# Altium schematic symbol library FPGA_Xilinx_Virtex7.SchLib: 34 symbols (part 7 of 34) (continued)
## XC7VH580T-HCG1155 (continued)
part M pins: AA3 GND (power), AA4 GND (power), AA7 GND (power), AA9 GND (power), AA11 GND (power), AA13 GND (power), AA15 GND (power), AA16 GND (power), AA17 GND (power), AA19 GND (power), AA21 GND (power), AA23 GND (power), AA25 GND (power), AA28 GND (power), AA31 GND (power), AA32 GND (power), AB1 GND (power), AB6 GND (power), AB7 GND (power), AB8 GND (power), AB10 GND (power), AB12 GND (power), AB13 GND (power), AB23 GND (power), AB28 GND (power), AB29 GND (power), AB34 GND (power), AC3 GND (power), AC7 GND (power), AC10 GND (power), AC20 GND (power), AC28 GND (power), AC32 GND (power), AD1 GND (power), AD5 GND (power), AD6 GND (power), AD7 GND (power), AD17 GND (power), AD27 GND (power), AD28 GND (power), AD29 GND (power), AD30 GND (power), AD34 GND (power), AE3 GND (power), AE4 GND (power), AE5 GND (power), AE14 GND (power), AE24 GND (power), AE30 GND (power), AE31 GND (power), AE32 GND (power), AF1 GND (power), AF2 GND (power), AF3 GND (power), AF11 GND (power), AF21 GND (power), AF31 GND (power), AF32 GND (power), AF33 GND (power), AF34 GND (power), AG8 GND (power), AG18 GND (power), AG28 GND (power), AH5 GND (power), AH15 GND (power), AH25 GND (power), AJ2 GND (power), AJ12 GND (power), AJ22 GND (power), AJ32 GND (power), AK9 GND (power), AK19 GND (power), AK29 GND (power), AL6 GND (power), AL16 GND (power), AL26 GND (power), AM3 GND (power), AM13 GND (power), AM23 GND (power), AM33 GND (power), AN10 GND (power), AN20 GND (power), AN30 GND (power), AP7 GND (power), AP17 GND (power), AP27 GND (power), AP34 GND (power), L5 GND (power), L6 GND (power), L13 GND (power), L15 GND (power), L17 GND (power), L19 GND (power), L21 GND (power), L22 GND (power), L26 GND (power), L30 GND (power), L32 GND (power), M1 GND (power), M2 GND (power), M5 GND (power), M6 GND (power), M7 GND (power), M14 GND (power), M16 GND (power), M18 GND (power), M20 GND (power), M22 GND (power), M23 GND (power), M28 GND (power), M29 GND (power), M30 GND (power), M33 GND (power), M34 GND (power), N3 GND (power), N4 GND (power), N7 GND (power), N10 GND (power), N13 GND (power), N15 GND (power), N19 GND (power), N21 GND (power), N28 GND (power), N31 GND (power), N32 GND (power), P1 GND (power), P6 GND (power), P7 GND (power), P16 GND (power), P22 GND (power), P27 GND (power), P28 GND (power), P29 GND (power), P34 GND (power), R3 GND (power), R7 GND (power), R13 GND (power), R17 GND (power), R18 GND (power), R19 GND (power), R21 GND (power), R24 GND (power), R28 GND (power), R32 GND (power), T1 GND (power), T2 GND (power), T5 GND (power), T6 GND (power), T7 GND (power), T8 GND (power), T10 GND (power), T12 GND (power), T14 GND (power), T16 GND (power), T20 GND (power), T22 GND (power), T26 GND (power), T28 GND (power), T29 GND (power), T30 GND (power), T33 GND (power), T34 GND (power), U3 GND (power), U4 GND (power), U7 GND (power), U9 GND (power), U11 GND (power), U13 GND (power), U15 GND (power), U19 GND (power), U21 GND (power), U23 GND (power), U25 GND (power), U28 GND (power), U31 GND (power), U32 GND (power), V1 GND (power), V5 GND (power), V7 GND (power), V10 GND (power), V12 GND (power), V14 GND (power), V16 GND (power), V20 GND (power), V22 GND (power), V24 GND (power), V26 GND (power), V28 GND (power), V30 GND (power), V34 GND (power), W3 GND (power), W7 GND (power), W9 GND (power), W11 GND (power), W13 GND (power), W15 GND (power), W19 GND (power), W21 GND (power), W23 GND (power), W25 GND (power), W28 GND (power), W32 GND (power), Y1 GND (power), Y2 GND (power), Y5 GND (power), Y6 GND (power), Y7 GND (power), Y10 GND (power), Y12 GND (power), Y14 GND (power), Y16 GND (power), Y18 GND (power), Y20 GND (power), Y22 GND (power), Y24 GND (power), Y26 GND (power), Y28 GND (power), Y29 GND (power), Y30 GND (power), Y33 GND (power), Y34 GND (power)

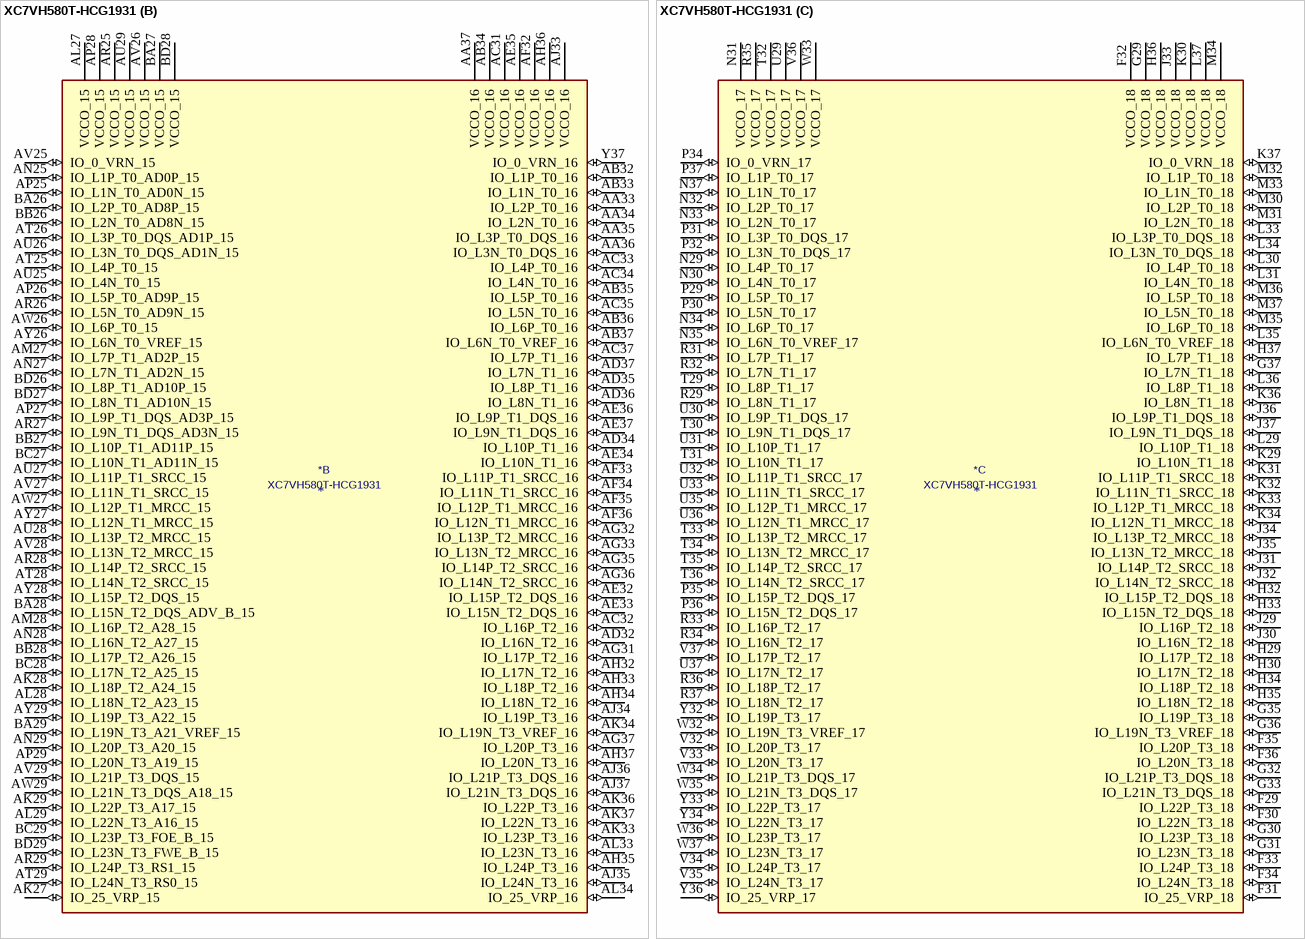
[diagram p37: symbol XC7VH580T-HCG1931]

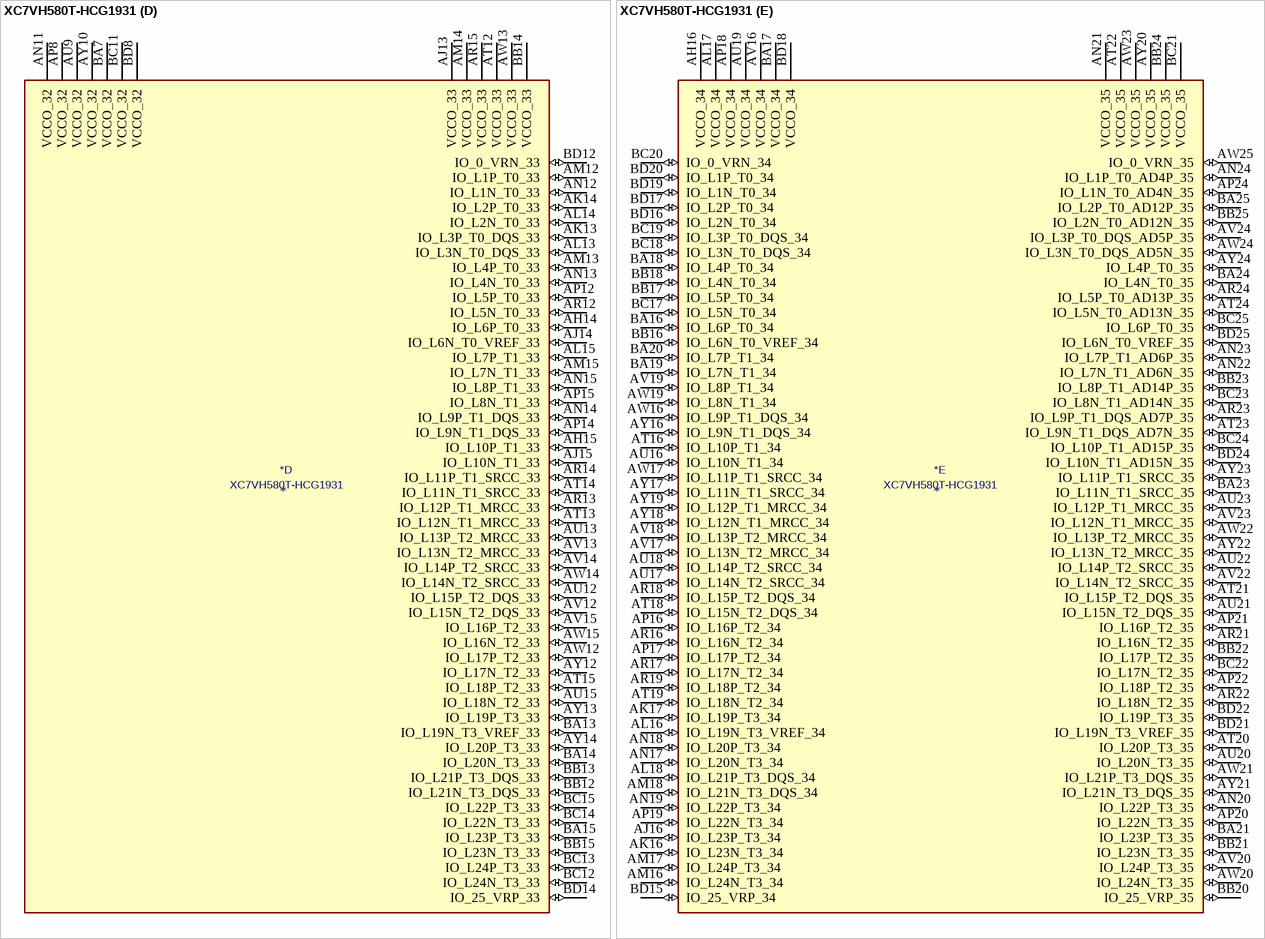
[diagram p38: symbol XC7VH580T-HCG1931]

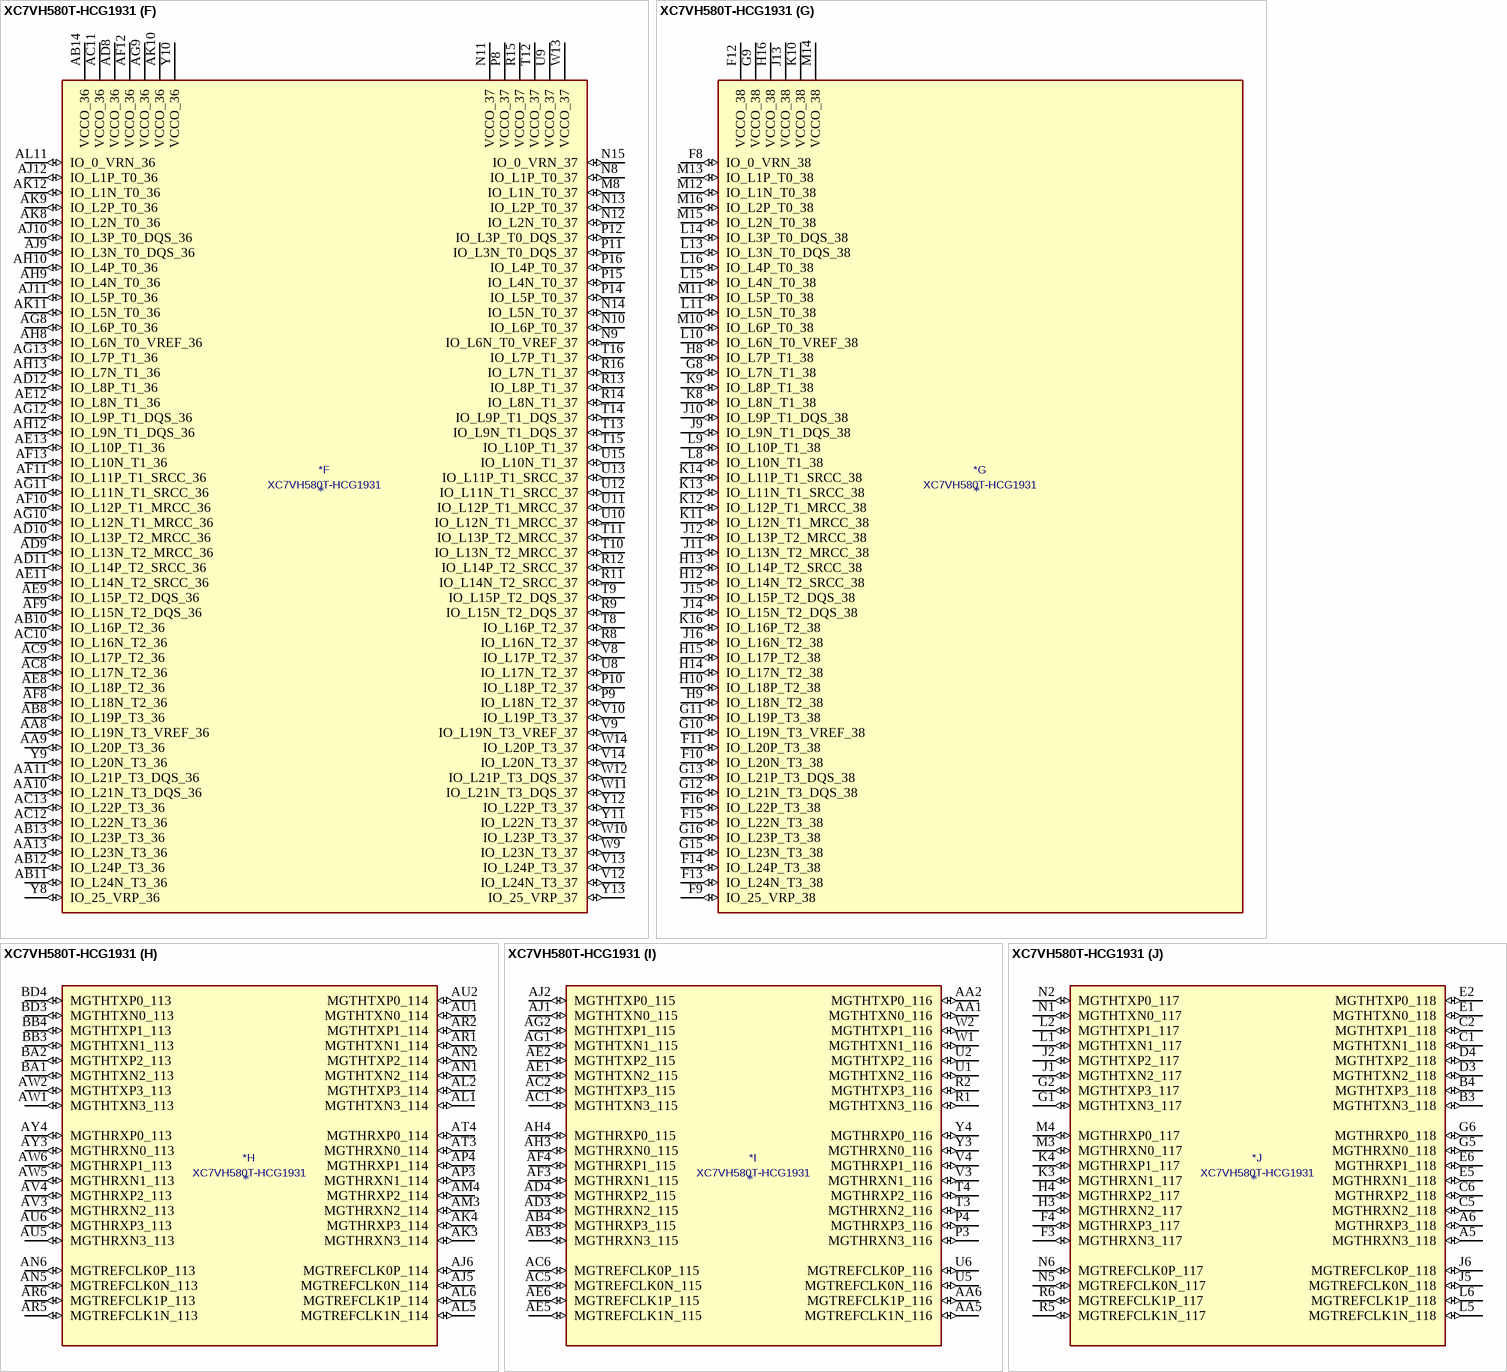
[diagram p39: symbol XC7VH580T-HCG1931]

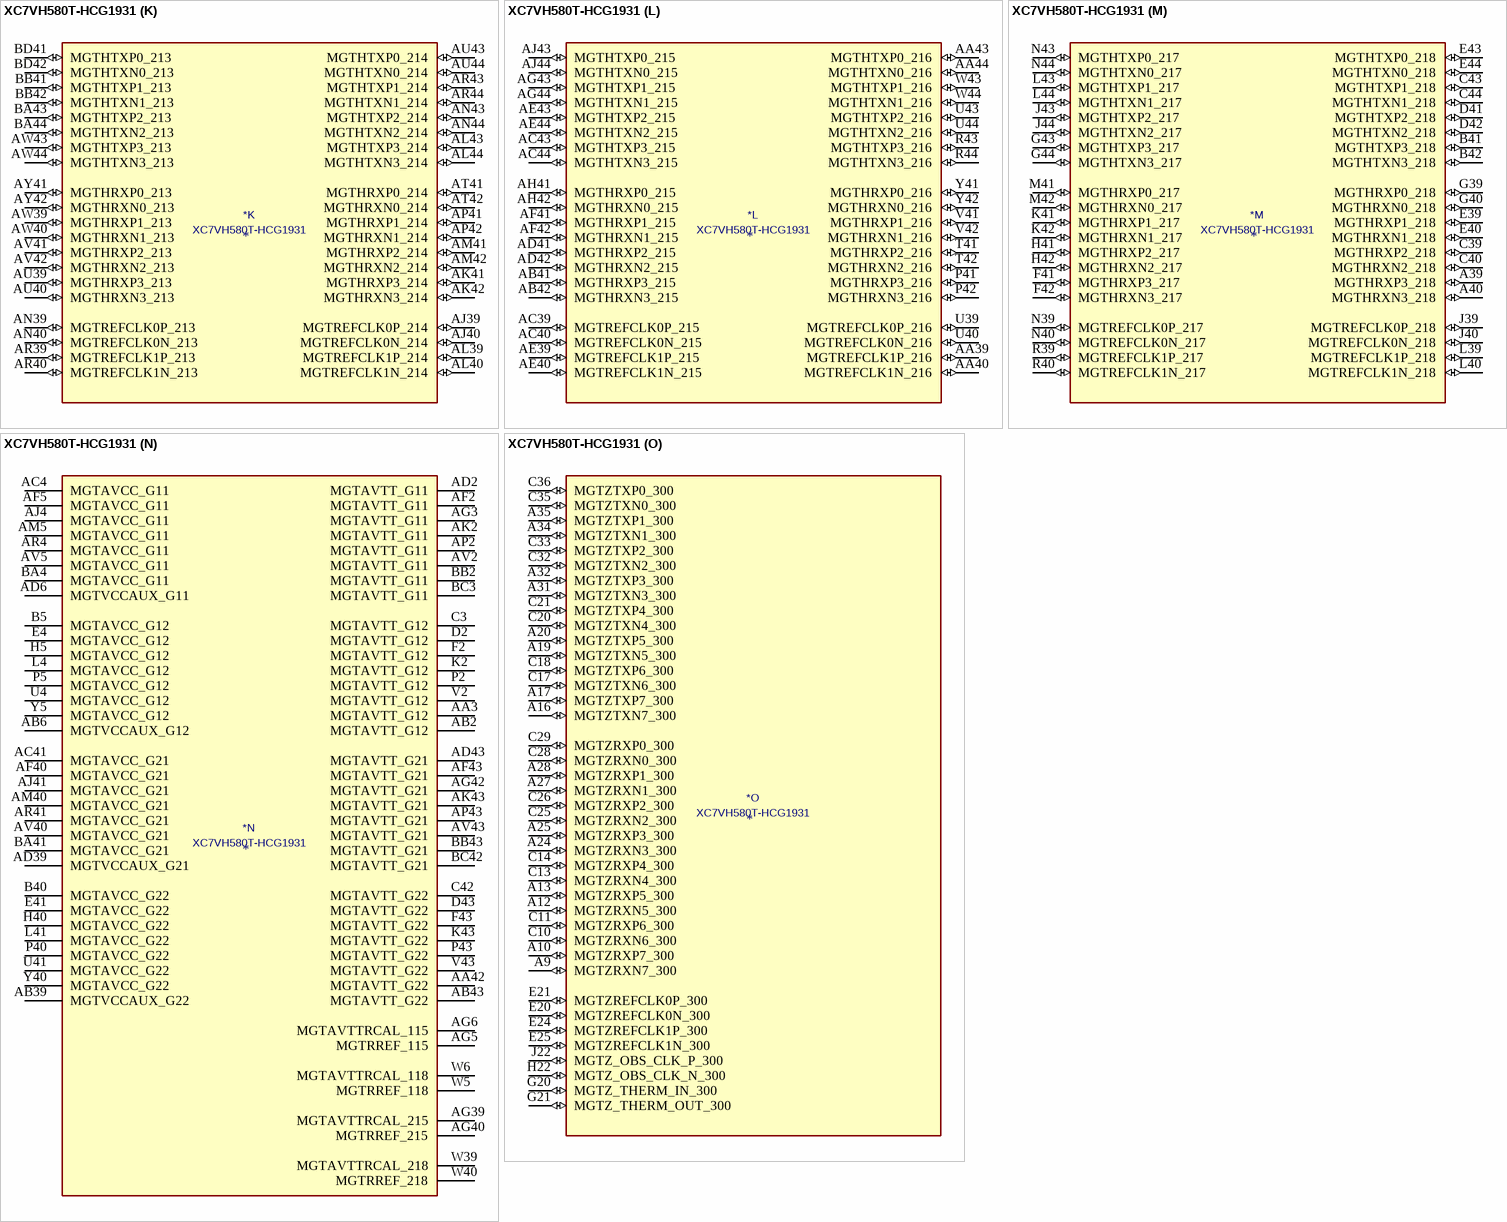
[diagram p40: symbol XC7VH580T-HCG1931]

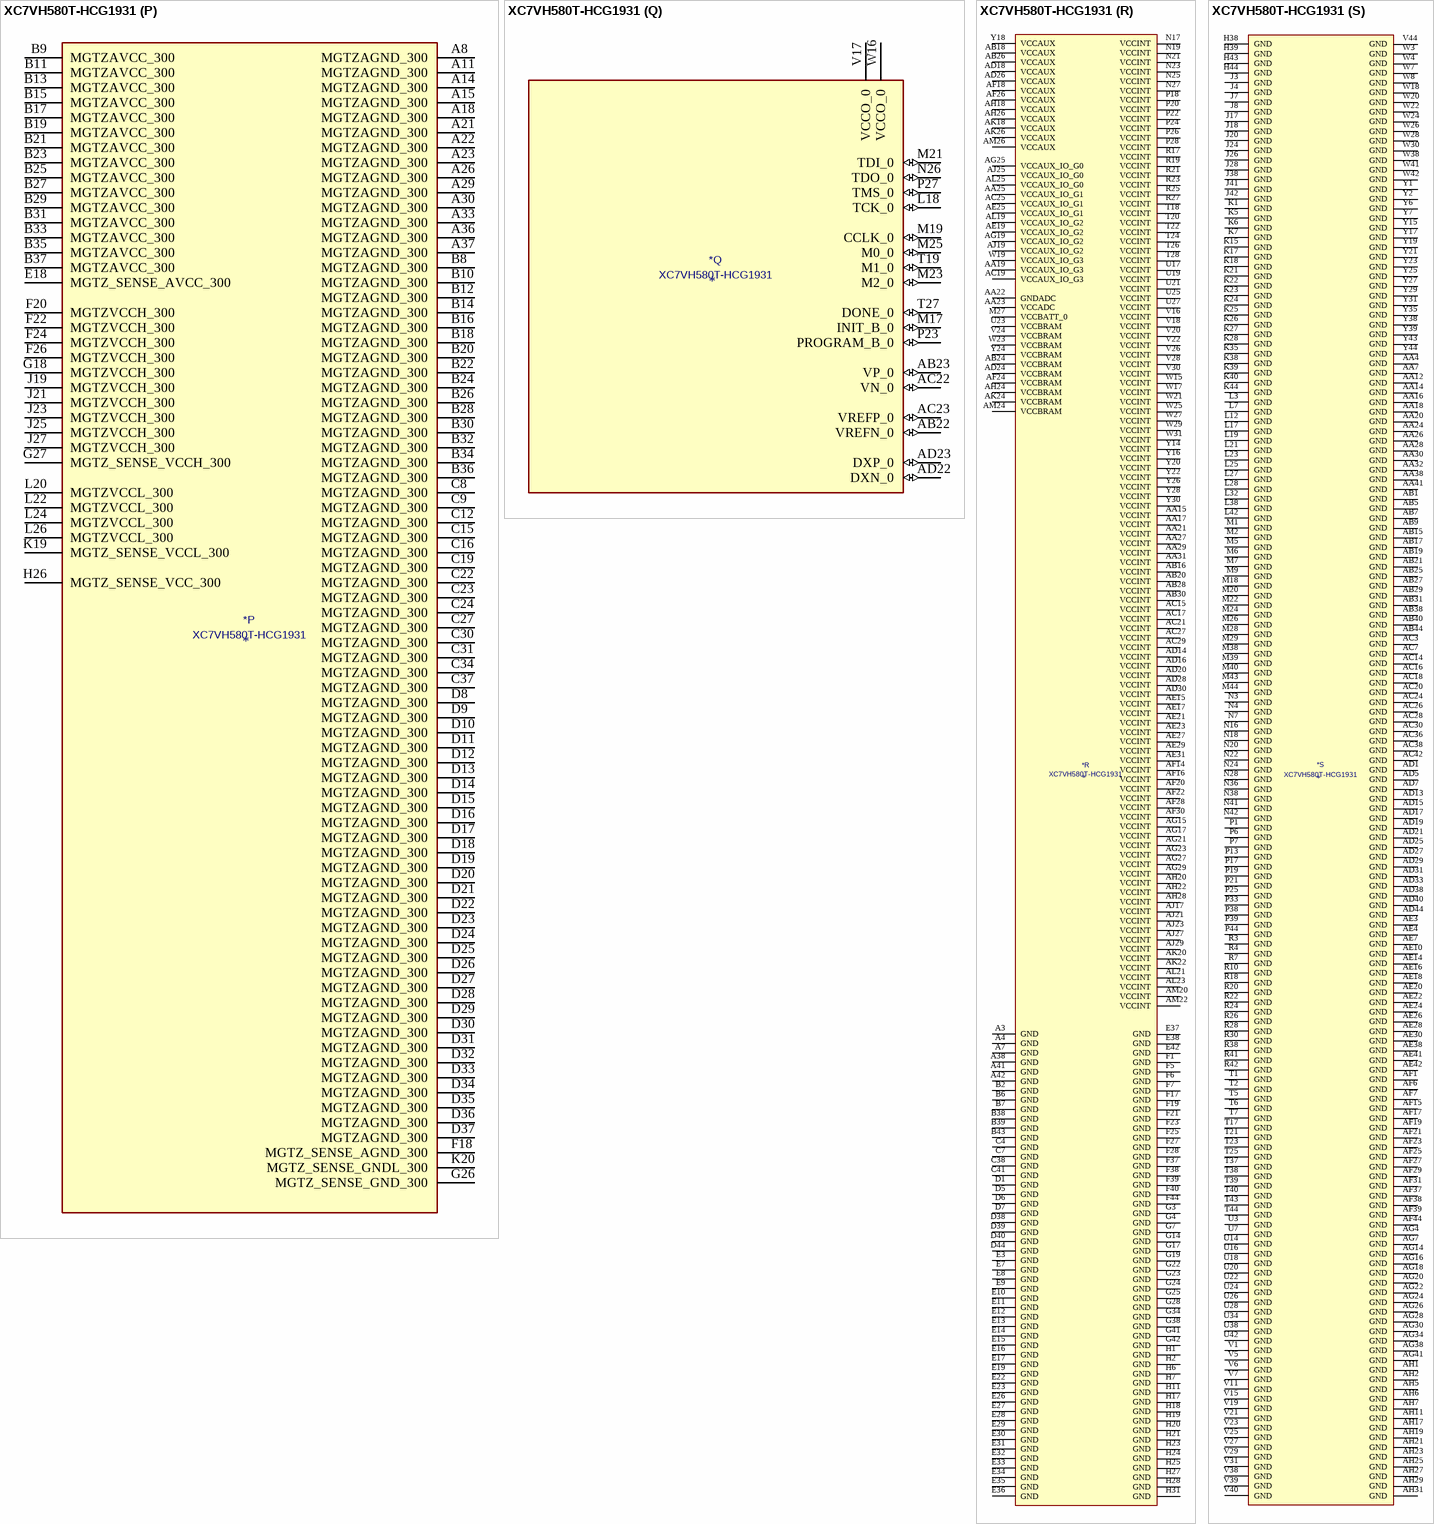
[diagram p41: symbol XC7VH580T-HCG1931]

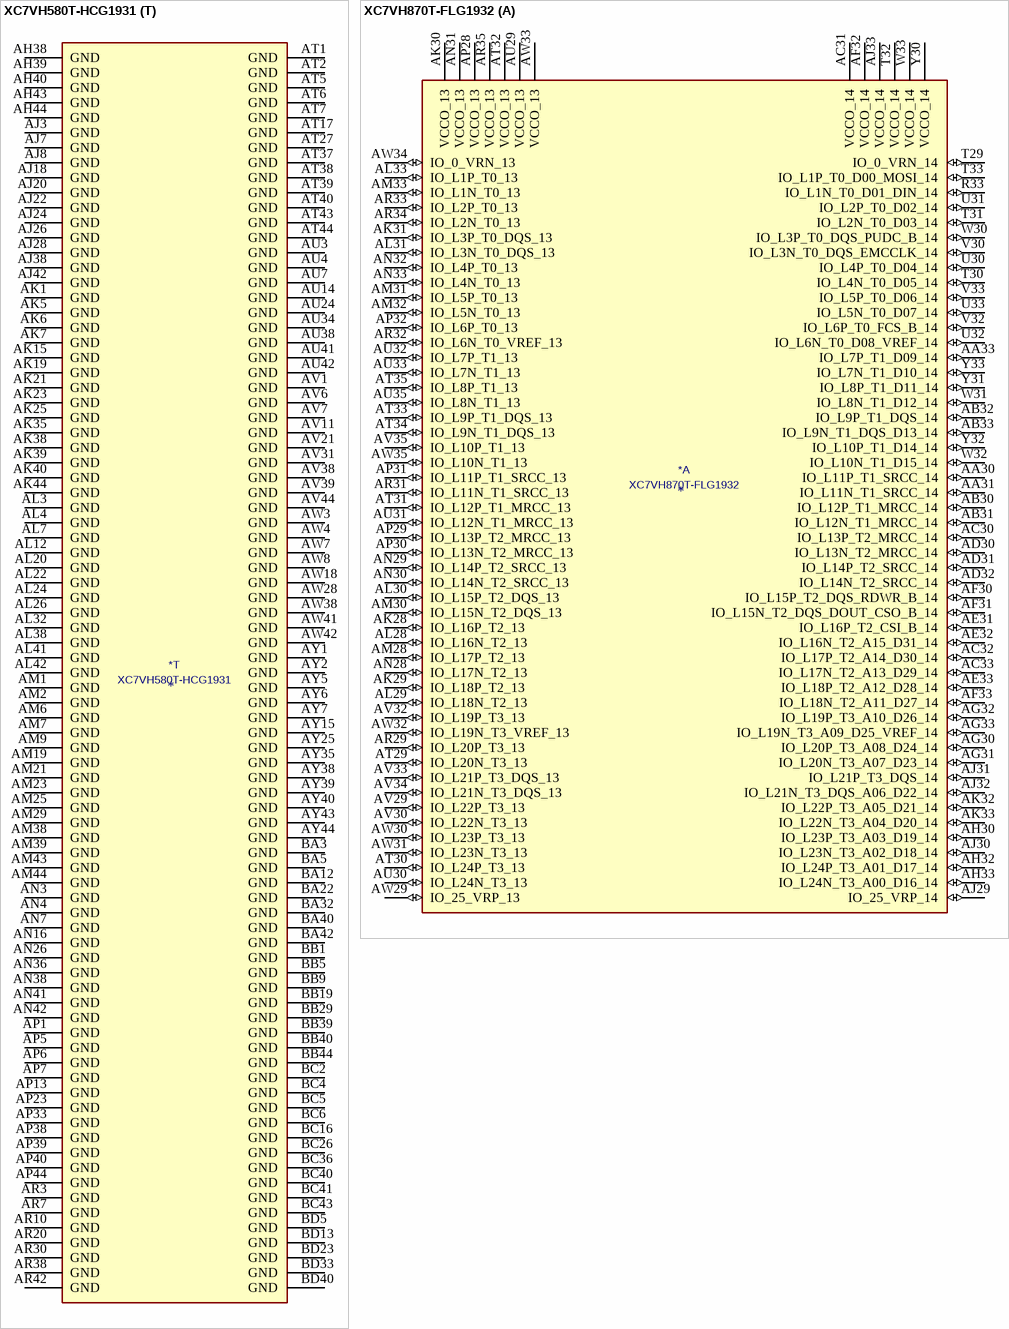
[diagram p42: symbols XC7VH580T-HCG1931 to XC7VH870T-FLG1932]